# Altium footprint library hallglib.PcbLib: 89 footprints (part 5 of 6)
Each footprint in its own frame and in the unit in brackets; x right, y up, seen from the top. Pads: shape width x height; smd on the part's side, far side on the other; paste and mask are expansions set on the pad; w line width, h text height; cw(c..) or ccw(c..) is an arc to the next point about the centre after c.
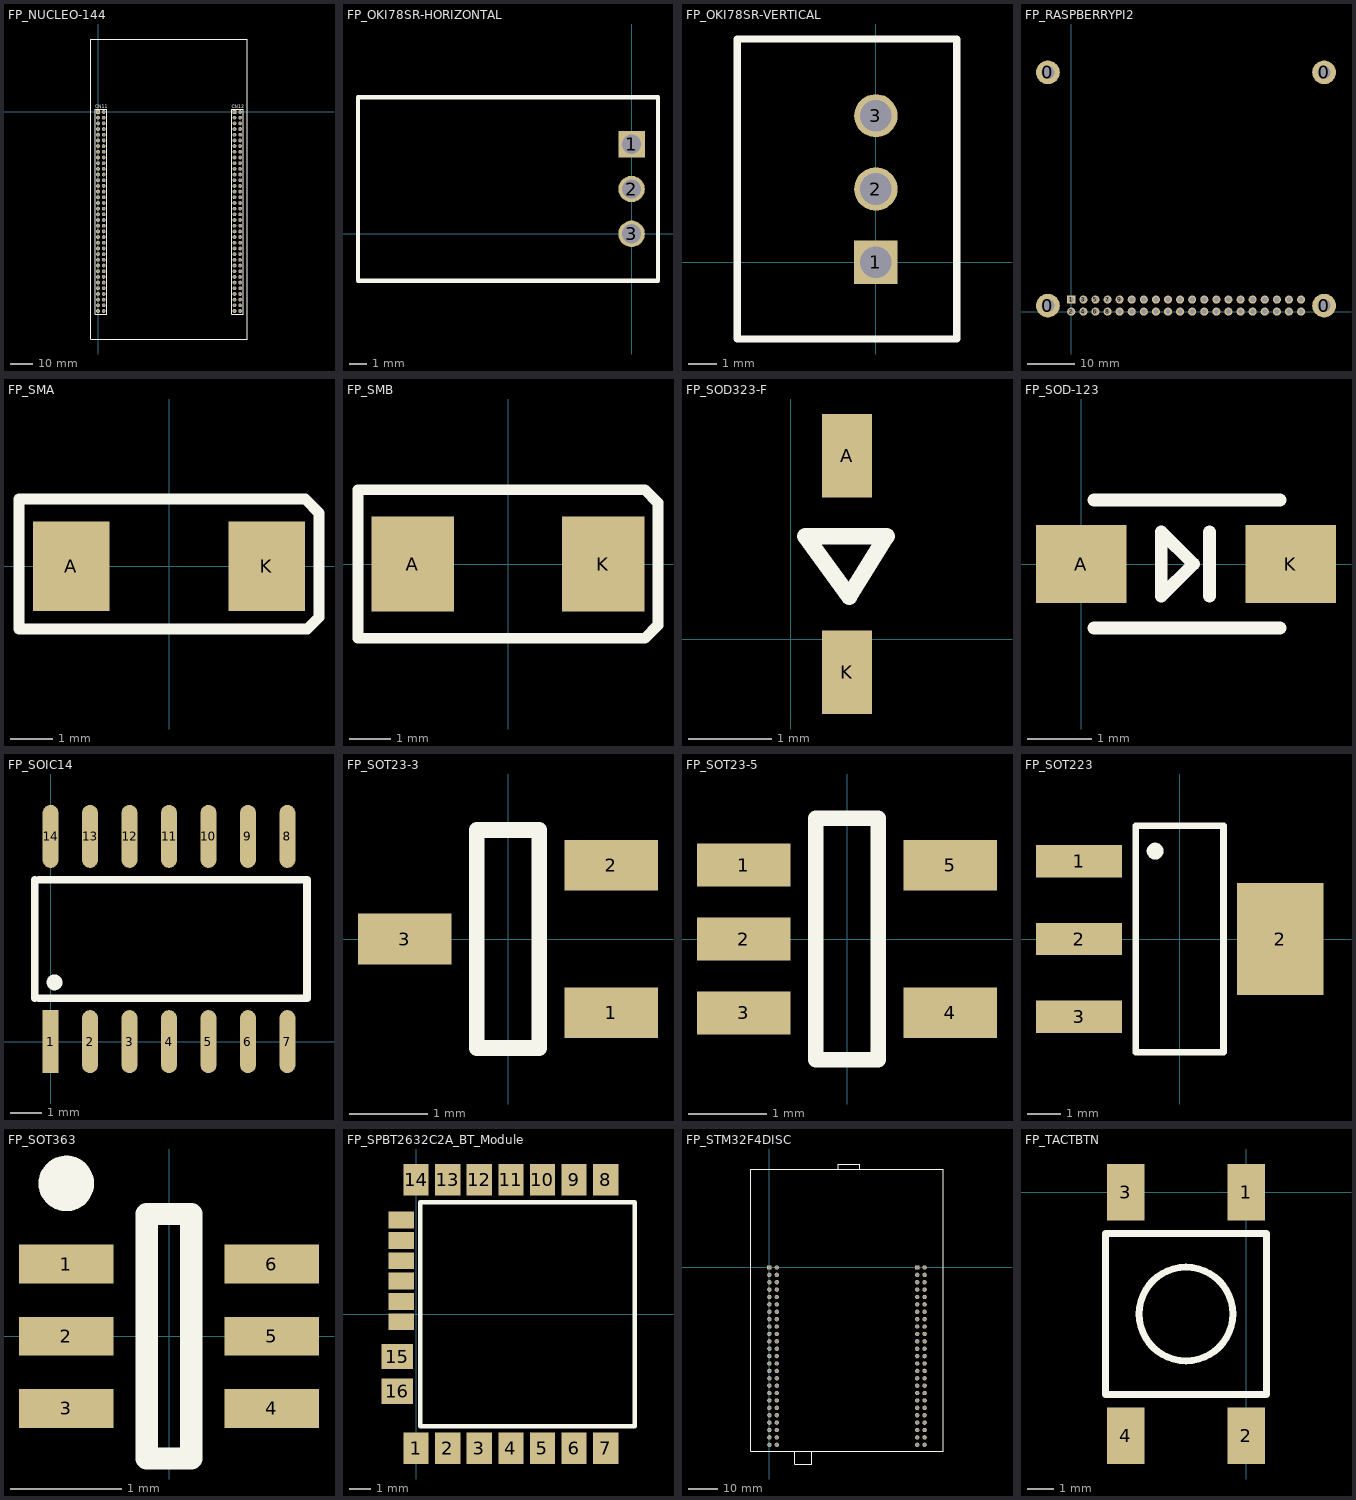
[diagram p4: the footprints below, top view; thin cyan lines are the x and y axes]

## FP_NUCLEO-144 [mm]
height 11
pads (144):
  rect 1.7x1.7 hole 1.1: 1(0,0) 73(60.96,0)
  round 1.7 hole 1.1: 2(2.54,0) 3(0,-2.54) 4(2.54,-2.54) 5(0,-5.08) 6(2.54,-5.08) 7(0,-7.62) 8(2.54,-7.62) 9(0,-10.16) 10(2.54,-10.16) 11(0,-12.7) 12(2.54,-12.7) 13(0,-15.24) 14(2.54,-15.24) 15(0,-17.78) 16(2.54,-17.78) 17(0,-20.32) 18(2.54,-20.32) 19(0,-22.86) 20(2.54,-22.86) 21(0,-25.4) 22(2.54,-25.4) 23(0,-27.94) 24(2.54,-27.94) 25(0,-30.48) 26(2.54,-30.48) 27(0,-33.02) 28(2.54,-33.02) 29(0,-35.56) 30(2.54,-35.56) 31(0,-38.1) 32(2.54,-38.1) 33(0,-40.64) 34(2.54,-40.64) 35(0,-43.18) 36(2.54,-43.18) 37(0,-45.72) 38(2.54,-45.72) 39(0,-48.26) 40(2.54,-48.26) 41(0,-50.8) 42(2.54,-50.8) 43(0,-53.34) 44(2.54,-53.34) 45(0,-55.88) 46(2.54,-55.88) 47(0,-58.42) 48(2.54,-58.42) 49(0,-60.96) 50(2.54,-60.96) 51(0,-63.5) 52(2.54,-63.5) 53(0,-66.04) 54(2.54,-66.04) 55(0,-68.58) 56(2.54,-68.58) 57(0,-71.12) 58(2.54,-71.12) 59(0,-73.66) 60(2.54,-73.66) 61(0,-76.2) 62(2.54,-76.2) 63(0,-78.74) 64(2.54,-78.74) 65(0,-81.28) 66(2.54,-81.28) 67(0,-83.82) 68(2.54,-83.82) 69(0,-86.36) 70(2.54,-86.36) 71(0,-88.9) 72(2.54,-88.9) 74(63.5,0) 75(60.96,-2.54) 76(63.5,-2.54) 77(60.96,-5.08) 78(63.5,-5.08) 79(60.96,-7.62) 80(63.5,-7.62) 81(60.96,-10.16) 82(63.5,-10.16) 83(60.96,-12.7) 84(63.5,-12.7) 85(60.96,-15.24) 86(63.5,-15.24) 87(60.96,-17.78) 88(63.5,-17.78) 89(60.96,-20.32) 90(63.5,-20.32) 91(60.96,-22.86) 92(63.5,-22.86) 93(60.96,-25.4) 94(63.5,-25.4) 95(60.96,-27.94) 96(63.5,-27.94) 97(60.96,-30.48) 98(63.5,-30.48) 99(60.96,-33.02) 100(63.5,-33.02) 101(60.96,-35.56) 102(63.5,-35.56) 103(60.96,-38.1) 104(63.5,-38.1) 105(60.96,-40.64) 106(63.5,-40.64) 107(60.96,-43.18) 108(63.5,-43.18) 109(60.96,-45.72) 110(63.5,-45.72) 111(60.96,-48.26) 112(63.5,-48.26) 113(60.96,-50.8) 114(63.5,-50.8) 115(60.96,-53.34) 116(63.5,-53.34) 117(60.96,-55.88) 118(63.5,-55.88) 119(60.96,-58.42) 120(63.5,-58.42) 121(60.96,-60.96) 122(63.5,-60.96) 123(60.96,-63.5) 124(63.5,-63.5) 125(60.96,-66.04) 126(63.5,-66.04) 127(60.96,-68.58) 128(63.5,-68.58) 129(60.96,-71.12) 130(63.5,-71.12) 131(60.96,-73.66) 132(63.5,-73.66) 133(60.96,-76.2) 134(63.5,-76.2) 135(60.96,-78.74) 136(63.5,-78.74) 137(60.96,-81.28) 138(63.5,-81.28) 139(60.96,-83.82) 140(63.5,-83.82) 141(60.96,-86.36) 142(63.5,-86.36) 143(60.96,-88.9) 144(63.5,-88.9)
Top Overlay:
  lines w0.2: -1.27,-90.3 3.81,-90.3 3.81,1.27 -1.27,1.27 -1.27,-90.3 ; 59.69,-90.3 64.77,-90.3 64.77,1.27 59.69,1.27 59.69,-90.3
  lines w0.254: -3.3,-101.4 -3.3,32.6 66.725,32.6 66.725,-101.4 -3.3,-101.4
  text "CN12" at 59.69,1.778 h1.52
  text "CN11" at -1.27,1.778 h1.52
3D body: height 11, standoff 3, extent 55.55,-1.346 56.21,-0.686
3D body: height 11, standoff 3, extent 53.01,-1.346 53.67,-0.686
3D body: height 11, standoff 3, extent 55.55,-3.886 56.21,-3.226
3D body: height 11, standoff 3, extent 53.01,-3.886 53.67,-3.226
3D body: height 11, standoff 3, extent 55.55,-6.426 56.21,-5.766
3D body: height 11, standoff 3, extent 53.01,-6.426 53.67,-5.766
3D body: height 11, standoff 3, extent 55.55,-8.966 56.21,-8.306
3D body: height 11, standoff 3, extent 53.01,-8.966 53.67,-8.306
3D body: height 11, standoff 3, extent 55.604,-11.477 56.264,-10.816
3D body: height 11, standoff 3, extent 53.064,-11.477 53.724,-10.816
3D body: height 11, standoff 3, extent 55.55,-14.046 56.21,-13.386
3D body: height 11, standoff 3, extent 53.01,-14.046 53.67,-13.386
3D body: height 11, standoff 3, extent 55.55,-16.586 56.21,-15.926
3D body: height 11, standoff 3, extent 53.01,-16.586 53.67,-15.926
3D body: height 11, standoff 3, extent 55.55,-19.126 56.21,-18.466
3D body: height 11, standoff 3, extent 53.01,-19.126 53.67,-18.466
3D body: height 11, standoff 3, extent 55.55,-21.666 56.21,-21.006
3D body: height 11, standoff 3, extent 53.01,-21.666 53.67,-21.006
3D body: height 11, standoff 3, extent 55.55,-24.206 56.21,-23.546
3D body: height 11, standoff 3, extent 53.01,-24.206 53.67,-23.546
3D body: height 11, standoff 3, extent 9.83,-10.49 10.49,-9.83
3D body: height 11, standoff 3, extent 7.29,-10.49 7.95,-9.83
3D body: height 11, standoff 3, extent 9.83,-13.03 10.49,-12.37
3D body: height 11, standoff 3, extent 7.29,-13.03 7.95,-12.37
3D body: height 11, standoff 3, extent 9.83,-15.57 10.49,-14.91
3D body: height 11, standoff 3, extent 7.29,-15.57 7.95,-14.91
3D body: height 11, standoff 3, extent 9.884,-18.081 10.544,-17.42
3D body: height 11, standoff 3, extent 7.344,-18.081 8.004,-17.42
3D body: height 11, standoff 3, extent 9.83,-20.65 10.49,-19.99
3D body: height 11, standoff 3, extent 7.29,-20.65 7.95,-19.99
3D body: height 11, standoff 3, extent 9.83,-23.19 10.49,-22.53
3D body: height 11, standoff 3, extent 7.29,-23.19 7.95,-22.53
3D body: height 11, standoff 3, extent 9.83,-25.73 10.49,-25.07
3D body: height 11, standoff 3, extent 7.29,-25.73 7.95,-25.07
3D body: height 11, standoff 3, extent 9.83,-28.27 10.49,-27.61
3D body: height 11, standoff 3, extent 7.29,-28.27 7.95,-27.61
3D body: height 11, standoff 3, extent 9.83,-33.35 10.49,-32.69
3D body: height 11, standoff 3, extent 7.29,-33.35 7.95,-32.69
3D body: height 11, standoff 3, extent 9.884,-35.861 10.544,-35.2
3D body: height 11, standoff 3, extent 7.344,-35.861 8.004,-35.2
3D body: height 11, standoff 3, extent 9.83,-38.43 10.49,-37.77
3D body: height 11, standoff 3, extent 7.29,-38.43 7.95,-37.77
3D body: height 11, standoff 3, extent 9.83,-40.97 10.49,-40.31
3D body: height 11, standoff 3, extent 7.29,-40.97 7.95,-40.31
3D body: height 11, standoff 3, extent 9.83,-43.51 10.49,-42.85
3D body: height 11, standoff 3, extent 7.29,-43.51 7.95,-42.85
3D body: height 11, standoff 3, extent 9.83,-46.05 10.49,-45.39
3D body: height 11, standoff 3, extent 7.29,-46.05 7.95,-45.39
3D body: height 11, standoff 3, extent 9.83,-48.59 10.49,-47.93
3D body: height 11, standoff 3, extent 7.29,-48.59 7.95,-47.93
3D body: height 11, standoff 3, extent 9.83,-51.13 10.49,-50.47
3D body: height 11, standoff 3, extent 7.29,-51.13 7.95,-50.47
3D body: height 11, standoff 3, extent 9.884,-53.641 10.544,-52.98
3D body: height 11, standoff 3, extent 7.344,-53.641 8.004,-52.98
3D body: height 11, standoff 3, extent 9.83,-56.21 10.49,-55.55
3D body: height 11, standoff 3, extent 7.29,-56.21 7.95,-55.55
3D body: height 11, standoff 3, extent 9.83,-58.75 10.49,-58.09
3D body: height 11, standoff 3, extent 7.29,-58.75 7.95,-58.09
3D body: height 11, standoff 3, extent 9.83,-61.29 10.49,-60.63
3D body: height 11, standoff 3, extent 7.29,-61.29 7.95,-60.63
3D body: height 11, standoff 3, extent 9.83,-63.83 10.49,-63.17
3D body: height 11, standoff 3, extent 7.29,-63.83 7.95,-63.17
3D body: height 11, standoff 3, extent 9.83,-66.37 10.49,-65.71
3D body: height 11, standoff 3, extent 7.29,-66.37 7.95,-65.71
3D body: height 11, standoff 3, extent 9.83,-68.91 10.49,-68.25
3D body: height 11, standoff 3, extent 7.29,-68.91 7.95,-68.25
3D body: height 11, standoff 8.46, extent 62.23,24.13 64.77,29.21
3D body: height 14, standoff 11, extent 63.17,27.61 63.83,28.27
3D body: height 14, standoff 11, extent 63.17,25.07 63.83,25.73
3D body: height 8.46, standoff 2.46, extent 63.17,25.07 63.83,25.73
3D body: height 8.46, standoff 2.46, extent 63.17,27.61 63.83,28.27
3D body: height 11, standoff 8.46, extent -1.27,24.13 1.27,29.21
3D body: height 14, standoff 11, extent -0.33,27.61 0.33,28.27
3D body: height 14, standoff 11, extent -0.33,25.07 0.33,25.73
3D body: height 8.46, standoff 2.46, extent -0.33,25.07 0.33,25.73
3D body: height 8.46, standoff 2.46, extent -0.33,27.61 0.33,28.27
3D body: height 12.5, standoff 11, extent -3.3,-101.4 66.7,32.6
3D body: height 11, standoff 8.46, extent -1.27,-1.27 3.81,1.27
3D body: height 11, standoff 8.46, extent -1.27,-8.89 3.81,-6.35
3D body: height 11, standoff 8.46, extent -1.27,-3.81 3.81,-1.27
3D body: height 11, standoff 8.46, extent -1.27,-6.35 3.81,-3.81
3D body: height 11, standoff 8.46, extent -1.27,-11.43 3.81,-8.89
3D body: height 11, standoff 8.46, extent -1.27,-13.97 3.81,-11.43
3D body: height 11, standoff 8.46, extent -1.27,-16.51 3.81,-13.97
3D body: height 11, standoff 8.46, extent -1.27,-19.05 3.81,-16.51
3D body: height 11, standoff 8.46, extent -1.27,-26.67 3.81,-24.13
3D body: height 11, standoff 8.46, extent -1.27,-21.59 3.81,-19.05
3D body: height 11, standoff 8.46, extent -1.27,-24.13 3.81,-21.59
3D body: height 11, standoff 8.46, extent -1.27,-29.21 3.81,-26.67
3D body: height 11, standoff 8.46, extent -1.27,-31.75 3.81,-29.21
3D body: height 11, standoff 8.46, extent -1.27,-34.29 3.81,-31.75
3D body: height 11, standoff 8.46, extent -1.27,-36.83 3.81,-34.29
3D body: height 11, standoff 8.46, extent -1.27,-44.45 3.81,-41.91
3D body: height 11, standoff 8.46, extent -1.27,-39.37 3.81,-36.83
3D body: height 11, standoff 8.46, extent -1.27,-41.91 3.81,-39.37
3D body: height 11, standoff 8.46, extent -1.27,-46.99 3.81,-44.45
3D body: height 11, standoff 8.46, extent -1.27,-49.53 3.81,-46.99
3D body: height 11, standoff 8.46, extent -1.27,-52.07 3.81,-49.53
3D body: height 11, standoff 8.46, extent -1.27,-54.61 3.81,-52.07
3D body: height 11, standoff 8.46, extent -1.27,-62.23 3.81,-59.69
3D body: height 11, standoff 8.46, extent -1.27,-57.15 3.81,-54.61
3D body: height 11, standoff 8.46, extent -1.27,-59.69 3.81,-57.15
3D body: height 11, standoff 8.46, extent -1.27,-64.77 3.81,-62.23
3D body: height 11, standoff 8.46, extent -1.27,-67.31 3.81,-64.77
3D body: height 11, standoff 8.46, extent -1.27,-69.85 3.81,-67.31
3D body: height 11, standoff 8.46, extent -1.27,-72.39 3.81,-69.85
3D body: height 11, standoff 8.46, extent -1.27,-80.01 3.81,-77.47
3D body: height 11, standoff 8.46, extent -1.27,-74.93 3.81,-72.39
3D body: height 11, standoff 8.46, extent -1.27,-77.47 3.81,-74.93
3D body: height 11, standoff 8.46, extent -1.27,-82.55 3.81,-80.01
3D body: height 11, standoff 8.46, extent -1.27,-85.09 3.81,-82.55
3D body: height 11, standoff 8.46, extent -1.27,-87.63 3.81,-85.09
3D body: height 11, standoff 8.46, extent -1.27,-90.17 3.81,-87.63
3D body: height 8.5, standoff 0, extent -1.269,-90.3 3.809,1.269
3D body: height 11, standoff 8.46, extent 59.69,-1.27 64.77,1.27
3D body: height 11, standoff 8.46, extent 59.69,-8.89 64.77,-6.35
3D body: height 11, standoff 8.46, extent 59.69,-3.81 64.77,-1.27
3D body: height 11, standoff 8.46, extent 59.69,-6.35 64.77,-3.81
3D body: height 11, standoff 8.46, extent 59.69,-11.43 64.77,-8.89
3D body: height 11, standoff 8.46, extent 59.69,-13.97 64.77,-11.43
3D body: height 11, standoff 8.46, extent 59.69,-16.51 64.77,-13.97
3D body: height 11, standoff 8.46, extent 59.69,-19.05 64.77,-16.51
3D body: height 11, standoff 8.46, extent 59.69,-26.67 64.77,-24.13
3D body: height 11, standoff 8.46, extent 59.69,-21.59 64.77,-19.05
3D body: height 11, standoff 8.46, extent 59.69,-24.13 64.77,-21.59
3D body: height 11, standoff 8.46, extent 59.69,-29.21 64.77,-26.67
3D body: height 11, standoff 8.46, extent 59.69,-31.75 64.77,-29.21
3D body: height 11, standoff 8.46, extent 59.69,-34.29 64.77,-31.75
3D body: height 11, standoff 8.46, extent 59.69,-36.83 64.77,-34.29
3D body: height 11, standoff 8.46, extent 59.69,-44.45 64.77,-41.91
3D body: height 11, standoff 8.46, extent 59.69,-39.37 64.77,-36.83
3D body: height 11, standoff 8.46, extent 59.69,-41.91 64.77,-39.37
3D body: height 11, standoff 8.46, extent 59.69,-46.99 64.77,-44.45
3D body: height 11, standoff 8.46, extent 59.69,-49.53 64.77,-46.99
3D body: height 11, standoff 8.46, extent 59.69,-52.07 64.77,-49.53
3D body: height 11, standoff 8.46, extent 59.69,-54.61 64.77,-52.07
3D body: height 11, standoff 8.46, extent 59.69,-62.23 64.77,-59.69
3D body: height 11, standoff 8.46, extent 59.69,-57.15 64.77,-54.61
3D body: height 11, standoff 8.46, extent 59.69,-59.69 64.77,-57.15
3D body: height 11, standoff 8.46, extent 59.69,-64.77 64.77,-62.23
3D body: height 11, standoff 8.46, extent 59.69,-67.31 64.77,-64.77
3D body: height 11, standoff 8.46, extent 59.69,-69.85 64.77,-67.31
3D body: height 11, standoff 8.46, extent 59.69,-72.39 64.77,-69.85
3D body: height 11, standoff 8.46, extent 59.69,-80.01 64.77,-77.47
3D body: height 11, standoff 8.46, extent 59.69,-74.93 64.77,-72.39
3D body: height 11, standoff 8.46, extent 59.69,-77.47 64.77,-74.93
3D body: height 11, standoff 8.46, extent 59.69,-82.55 64.77,-80.01
3D body: height 11, standoff 8.46, extent 59.69,-85.09 64.77,-82.55
3D body: height 11, standoff 8.46, extent 59.69,-87.63 64.77,-85.09
3D body: height 11, standoff 8.46, extent 59.69,-90.17 64.77,-87.63
3D body: height 14, standoff 11, extent 63.17,-89.23 63.83,-88.57
3D body: height 14, standoff 11, extent 60.63,-89.23 61.29,-88.57
3D body: height 8.46, standoff 2.46, extent 60.63,-89.23 61.29,-88.57
3D body: height 8.46, standoff 2.46, extent 63.17,-89.23 63.83,-88.57
3D body: height 14, standoff 11, extent 2.21,-89.23 2.87,-88.57
3D body: height 14, standoff 11, extent -0.33,-89.23 0.33,-88.57
3D body: height 8.46, standoff 2.46, extent -0.33,-89.23 0.33,-88.57
3D body: height 8.46, standoff 2.46, extent 2.21,-89.23 2.87,-88.57
3D body: height 8.5, standoff 0, extent 59.691,-90.3 64.769,1.269
3D body: height 11, standoff 3, extent 55.55,-28.27 56.21,-27.61
3D body: height 11, standoff 3, extent 53.01,-28.27 53.67,-27.61
3D body: height 11, standoff 3, extent 55.55,-30.81 56.21,-30.15
3D body: height 11, standoff 3, extent 53.01,-30.81 53.67,-30.15
3D body: height 11, standoff 3, extent 55.55,-33.35 56.21,-32.69
3D body: height 11, standoff 3, extent 53.01,-33.35 53.67,-32.69
3D body: height 11, standoff 3, extent 55.604,-35.861 56.264,-35.2
3D body: height 11, standoff 3, extent 53.064,-35.861 53.724,-35.2
3D body: height 11, standoff 3, extent 55.55,-38.43 56.21,-37.77
3D body: height 11, standoff 3, extent 53.01,-38.43 53.67,-37.77
3D body: height 11, standoff 3, extent 55.55,-40.97 56.21,-40.31
3D body: height 11, standoff 3, extent 53.01,-40.97 53.67,-40.31
3D body: height 11, standoff 3, extent 55.55,-43.51 56.21,-42.85
3D body: height 11, standoff 3, extent 53.01,-43.51 53.67,-42.85
3D body: height 11, standoff 3, extent 55.55,-46.05 56.21,-45.39
3D body: height 11, standoff 3, extent 53.01,-46.05 53.67,-45.39
3D body: height 11, standoff 3, extent 55.55,-48.59 56.21,-47.93
3D body: height 11, standoff 3, extent 53.01,-48.59 53.67,-47.93
3D body: height 11, standoff 3, extent 55.55,-51.13 56.21,-50.47
3D body: height 11, standoff 3, extent 53.01,-51.13 53.67,-50.47
3D body: height 11, standoff 3, extent 55.604,-53.641 56.264,-52.98
3D body: height 11, standoff 3, extent 53.064,-53.641 53.724,-52.98
3D body: height 11, standoff 3, extent 55.55,-56.21 56.21,-55.55
3D body: height 11, standoff 3, extent 53.01,-56.21 53.67,-55.55
3D body: height 11, standoff 3, extent 55.55,-58.75 56.21,-58.09
3D body: height 11, standoff 3, extent 53.01,-58.75 53.67,-58.09
3D body: height 11, standoff 3, extent 55.55,-61.29 56.21,-60.63
3D body: height 11, standoff 3, extent 53.01,-61.29 53.67,-60.63
3D body: height 11, standoff 3, extent 55.55,-63.83 56.21,-63.17
3D body: height 11, standoff 3, extent 53.01,-63.83 53.67,-63.17
3D body: height 11, standoff 3, extent 55.55,-66.37 56.21,-65.71
3D body: height 11, standoff 3, extent 53.01,-66.37 53.67,-65.71
3D body: height 11, standoff 3, extent 55.55,-68.91 56.21,-68.25
3D body: height 11, standoff 3, extent 53.01,-68.91 53.67,-68.25

## FP_OKI78SR-HORIZONTAL [mm] "OKI regulator"
height 8.6
pads (3):
  rect 1.5x1.5 hole 1.1: 1(0,5.08)
  round 1.5 hole 1.1: 2(0,2.54) 3(0,0)
Top Overlay:
  lines w0.254: -15.5,-2.66 1.5,-2.66 1.5,7.74 -15.5,7.74 -15.5,-2.66
3D body "mps_dcdc_oki_78sr_horiz_a.step": height 7.67, standoff -5.26, extent -15.235,-2.621 1.275,7.793

## FP_OKI78SR-VERTICAL [mm] "OKI regulator"
height 16.5
pads (3):
  rect 1.5x1.5 hole 1.1: 1(0,0)
  round 1.5 hole 1.1: 2(0,2.54) 3(0,5.08)
Top Overlay:
  lines w0.254: -4.8,-2.66 -4.8,7.74 2.8,7.74 2.8,-2.66 -4.8,-2.66
3D body "mps_dcdc_oki_78sr_a.step": height 16.52, standoff -3.29, extent -4.875,-2.667 2.859,7.747

## FP_RASPBERRYPI2 [mm] "Raspberry Pi 2"
pads (44):
  round 5 hole 2.7: 0(-4.9,1.25) 0(-4.9,50.25) 0(53.1,1.25) 0(53.1,50.25)
  rect 1.7x1.7 hole 1.1: 1(0,2.54)
  round 1.7 hole 1.1: 2(0,0) 3(2.54,2.54) 4(2.54,0) 5(5.08,2.54) 6(5.08,0) 7(7.62,2.54) 8(7.62,0) 9(10.16,2.54) 10(10.16,0) 11(12.7,2.54) 12(12.7,0) 13(15.24,2.54) 14(15.24,0) 15(17.78,2.54) 16(17.78,0) 17(20.32,2.54) 18(20.32,0) 19(22.86,2.54) 20(22.86,0) 21(25.4,2.54) 22(25.4,0) 23(27.94,2.54) 24(27.94,0) 25(30.48,2.54) 26(30.48,0) 27(33.02,2.54) 28(33.02,0) 29(35.56,2.54) 30(35.56,0) 31(38.1,2.54) 32(38.1,0) 33(40.64,2.54) 34(40.64,0) 35(43.18,2.54) 36(43.18,0) 37(45.72,2.54) 38(45.72,0) 39(48.26,2.54) 40(48.26,0)
3D body "Raspberry_Pi_Model_B+_3D_Assy.STEP": height 13.87, standoff -5.53, extent -8.001,-2.413 79.149,56.087
3D body: height 9, standoff 0, extent -1.27,-1.27 50.165,3.81
3D body: height 0, standoff -3.2, extent -0.325,2.34 0.325,2.74
3D body: height 0, standoff -3.2, extent 2.215,2.34 2.865,2.74
3D body: height 0, standoff -3.2, extent 4.755,2.34 5.405,2.74
3D body: height 0, standoff -3.2, extent 7.295,2.34 7.945,2.74
3D body: height 0, standoff -3.2, extent 9.835,2.34 10.485,2.74
3D body: height 0, standoff -3.2, extent 12.375,2.34 13.025,2.74
3D body: height 0, standoff -3.2, extent 14.915,2.34 15.565,2.74
3D body: height 0, standoff -3.2, extent 17.455,2.34 18.105,2.74
3D body: height 0, standoff -3.2, extent 19.995,2.34 20.645,2.74
3D body: height 0, standoff -3.2, extent 22.535,2.34 23.185,2.74
3D body: height 0, standoff -3.2, extent 25.075,2.34 25.725,2.74
3D body: height 0, standoff -3.2, extent 27.615,2.34 28.265,2.74
3D body: height 0, standoff -3.2, extent 30.155,2.34 30.805,2.74
3D body: height 0, standoff -3.2, extent 32.695,2.34 33.345,2.74
3D body: height 0, standoff -3.2, extent 35.235,2.34 35.885,2.74
3D body: height 0, standoff -3.2, extent 37.775,2.34 38.425,2.74
3D body: height 0, standoff -3.2, extent 40.315,2.34 40.965,2.74
3D body: height 0, standoff -3.2, extent 42.855,2.34 43.505,2.74
3D body: height 0, standoff -3.2, extent 45.395,2.34 46.045,2.74
3D body: height 0, standoff -3.2, extent 47.935,2.34 48.585,2.74
3D body: height 0, standoff -3.2, extent -0.325,-0.2 0.325,0.2
3D body: height 0, standoff -3.2, extent 2.215,-0.2 2.865,0.2
3D body: height 0, standoff -3.2, extent 4.755,-0.2 5.405,0.2
3D body: height 0, standoff -3.2, extent 7.295,-0.2 7.945,0.2
3D body: height 0, standoff -3.2, extent 9.835,-0.2 10.485,0.2
3D body: height 0, standoff -3.2, extent 12.375,-0.2 13.025,0.2
3D body: height 0, standoff -3.2, extent 14.915,-0.2 15.565,0.2
3D body: height 0, standoff -3.2, extent 17.455,-0.2 18.105,0.2
3D body: height 0, standoff -3.2, extent 19.995,-0.2 20.645,0.2
3D body: height 0, standoff -3.2, extent 22.535,-0.2 23.185,0.2
3D body: height 0, standoff -3.2, extent 25.075,-0.2 25.725,0.2
3D body: height 0, standoff -3.2, extent 27.615,-0.2 28.265,0.2
3D body: height 0, standoff -3.2, extent 30.155,-0.2 30.805,0.2
3D body: height 0, standoff -3.2, extent 32.695,-0.2 33.345,0.2
3D body: height 0, standoff -3.2, extent 35.235,-0.2 35.885,0.2
3D body: height 0, standoff -3.2, extent 37.775,-0.2 38.425,0.2
3D body: height 0, standoff -3.2, extent 40.315,-0.2 40.965,0.2
3D body: height 0, standoff -3.2, extent 42.855,-0.2 43.505,0.2
3D body: height 0, standoff -3.2, extent 45.395,-0.2 46.045,0.2
3D body: height 0, standoff -3.2, extent 47.935,-0.2 48.585,0.2

## FP_SMA [mm] "SMA footprint"
height 2
pads (2):
  rect 1.8x2.1 smd: A(-2.3,0) K(2.3,0)
Top Overlay:
  lines w0.254: -3.525,-1.475 -3.525,1.575 3.2,1.575 3.525,1.25 3.525,-1.2 3.25,-1.475 -3.525,-1.475
3D body "User Library-S1G-1.STEP": height 2.7, standoff 0, extent -2.8,-1.475 2.8,1.475

## FP_SMB [mm] "DO214-AA tok (SMB)"
height 2.5
pads (2):
  rect 2x2.3 smd: A(-2.3,0) K(2.3,0)
Top Overlay:
  lines w0.254: -3.625,-1.8 3.3,-1.8 3.625,-1.475 3.625,1.475 3.3,1.8 -3.625,1.8 -3.625,-1.8
3D body "DO-214AA SMB.STEP": height 2.32, standoff 0.02, extent -2.7,-1.8 2.7,1.8

## FP_SOD323-F [mm] "SOD323-F (SC-90)"
height 0.8
pads (2):
  rect 0.6x1 smd: A(0.675,2.2) K(0.675,-0.4)
Top Overlay:
  lines w0.2: 0.175,1.233 0.7,0.508 1.15,1.233 0.175,1.233
3D body "SOD-323F.STEP": height 0.79, standoff -0.08, extent 0.022,-0.461 1.372,2.239

## FP_SOD-123 [mm]
height 1.168
pads (2):
  rect 1.41x1.22 smd: A(0,0) K(3.27,0)
Top Overlay:
  lines w0.2: 0.2,-1 3.1,-1 ; 0.2,1 3.1,1 ; 2,-0.5 2,0.5 ; 1.25,-0.5 1.25,0.5 1.75,0 1.25,-0.5
3D body "SOD-123_DiodesInc.STEP": height 1.47, standoff 0.02, extent -0.3,-0.85 3.55,0.85

## FP_SOIC14 [mil] "SOIC-14 egyesek szerint narrow, RET szerint normál"
height 69
pads (14):
  rect 20x80 smd: 1(0,0)
  oval 20x80 smd: 2(50,0) 3(100,0) 4(150,0) 5(200,0) 6(250,0) 7(300,0) 8(300,260) 9(250,260) 10(200,260) 11(150,260) 12(100,260) 13(50,260) 14(0,260)
Top Overlay:
  circle w10: c5,75 r5
  lines w10: -20,55 -20,205 ; -15,55 325,55 325,205 -15,205
3D body "SOIC14N.STEP": height 62.99, standoff 0, extent -22.25,9.8 322.24,248.21

## FP_SOT23-3 [mm] "SOT23-3 tok"
height 1.1
pads (3):
  rect 1.2x0.65 smd: 1(1.327,-0.95) 2(1.327,0.95) 3(-1.327,0)
Top Overlay:
  lines w0.2: -0.4,-1.4 -0.4,1.4 0.4,1.4 0.4,-1.4 -0.4,-1.4
3D body "SOT-23.STEP": height 0.97, standoff -0.01, extent -1.274,-1.46 1.274,1.46

## FP_SOT23-5 [mm] "SOT23, 5-Leads, Body 2.9x1.6mm, Pitch 0.95mm, Lead Span 2.8mm, IPC Medium Density"
height 1.19
pads (5):
  rect 1.2x0.55 smd: 1(-1.327,0.95) 2(-1.327,0) 3(-1.327,-0.95)
  rect 1.2x0.65 smd: 4(1.327,-0.95) 5(1.327,0.95)
Top Overlay:
  lines w0.2: -0.4,-1.55 -0.4,1.55 0.4,1.55 0.4,-1.55 -0.4,-1.55
3D body "SOT-23-5.STEP": height 1, standoff 0, extent -1.17,-1.46 1.17,1.46

## FP_SOT223 [mm] "SOT223 package, 3 leads"
height 1.8
pads (4):
  rect 2.55x0.95 smd: 1(-2.975,2.3) 2(-2.975,0) 3(-2.975,-2.3)
  rect 2.55x3.3 smd: 2(2.975,0)
Top Overlay:
  circle w0.25: c-0.725,2.6 r0.125
  lines w0.2: -1.3,-3.35 1.3,-3.35 1.3,3.35 -1.3,3.35 -1.3,-3.35
3D body "SOT-223-1.STEP": height 1.65, standoff 0, extent -3.5,-3.25 3.5,3.25

## FP_SOT363 [mm] "SOT363 (SC-88) package 6 leads"
height 1.1
pads (6):
  rect 0.85x0.35 smd: 1(-0.925,0.65) 2(-0.925,0) 3(-0.925,-0.65) 4(0.925,-0.65) 5(0.925,0) 6(0.925,0.65)
Top Overlay:
  circle w0.25: c-0.925,1.375 r0.125
  lines w0.2: -0.2,-1.1 -0.2,1.1 0.2,1.1 0.2,-1.1 -0.2,-1.1
3D body "SOT363.STEP": height 0.98, standoff -0.01, extent -1.05,-1 1.05,1

## FP_SPBT2632C2A_BT_Module [mm] "Bluetooth technology class-2 module"
height 2.9
pads (22):
  rect 1.2x1.5 smd: 1(0,-6.37) 2(1.5,-6.37) 3(3,-6.37) 4(4.5,-6.37) 5(6,-6.37) 6(7.5,-6.37) 7(9,-6.37) 8(9,6.37) 9(7.5,6.37) 10(6,6.37) 11(4.5,6.37) 12(3,6.37) 13(1.5,6.37) 14(0,6.37)
  rect 1.5x1.2 smd: 15(-0.9,-2.02) 16(-0.9,-3.67)
  rect 1.2x0.8 smd: ""(-0.7,-0.37) ""(-0.7,0.595) ""(-0.7,1.56) ""(-0.7,2.525) ""(-0.7,3.49) ""(-0.7,4.455)
Top Overlay:
  lines w0.2: 0.2,-5.325 10.375,-5.325 10.375,5.3 0.2,5.3 0.2,-5.325
3D body: height 1.5, standoff 0, extent -1.228,-6.75 10.372,6.75

## FP_STM32F4DISC [mm] "STM32 F4 Discovery evaluation board"
pads (100):
  rect 1.5x1.5 hole 1.1: 1(0,0) 51(50.8,0)
  round 1.5 hole 1.1: 2(2.54,0) 3(0,-2.54) 4(2.54,-2.54) 5(0,-5.08) 6(2.54,-5.08) 7(0,-7.62) 8(2.54,-7.62) 9(0,-10.16) 10(2.54,-10.16) 11(0,-12.7) 12(2.54,-12.7) 13(0,-15.24) 14(2.54,-15.24) 15(0,-17.78) 16(2.54,-17.78) 17(0,-20.32) 18(2.54,-20.32) 19(0,-22.86) 20(2.54,-22.86) 21(0,-25.4) 22(2.54,-25.4) 23(0,-27.94) 24(2.54,-27.94) 25(0,-30.48) 26(2.54,-30.48) 27(0,-33.02) 28(2.54,-33.02) 29(0,-35.56) 30(2.54,-35.56) 31(0,-38.1) 32(2.54,-38.1) 33(0,-40.64) 34(2.54,-40.64) 35(0,-43.18) 36(2.54,-43.18) 37(0,-45.72) 38(2.54,-45.72) 39(0,-48.26) 40(2.54,-48.26) 41(0,-50.8) 42(2.54,-50.8) 43(0,-53.34) 44(2.54,-53.34) 45(0,-55.88) 46(2.54,-55.88) 47(0,-58.42) 48(2.54,-58.42) 49(0,-60.96) 50(2.54,-60.96) 52(53.34,0) 53(50.8,-2.54) 54(53.34,-2.54) 55(50.8,-5.08) 56(53.34,-5.08) 57(50.8,-7.62) 58(53.34,-7.62) 59(50.8,-10.16) 60(53.34,-10.16) 61(50.8,-12.7) 62(53.34,-12.7) 63(50.8,-15.24) 64(53.34,-15.24) 65(50.8,-17.78) 66(53.34,-17.78) 67(50.8,-20.32) 68(53.34,-20.32) 69(50.8,-22.86) 70(53.34,-22.86) 71(50.8,-25.4) 72(53.34,-25.4) 73(50.8,-27.94) 74(53.34,-27.94) 75(50.8,-30.48) 76(53.34,-30.48) 77(50.8,-33.02) 78(53.34,-33.02) 79(50.8,-35.56) 80(53.34,-35.56) 81(50.8,-38.1) 82(53.34,-38.1) 83(50.8,-40.64) 84(53.34,-40.64) 85(50.8,-43.18) 86(53.34,-43.18) 87(50.8,-45.72) 88(53.34,-45.72) 89(50.8,-48.26) 90(53.34,-48.26) 91(50.8,-50.8) 92(53.34,-50.8) 93(50.8,-53.34) 94(53.34,-53.34) 95(50.8,-55.88) 96(53.34,-55.88) 97(50.8,-58.42) 98(53.34,-58.42) 99(50.8,-60.96) 100(53.34,-60.96)
Top Overlay:
  lines w0.254: 8.636,-63.18 8.636,-67.564 14.605,-67.564 14.605,-63.18 ; 20.574,33.82 23.622,33.82 23.622,35.56 30.988,35.56 30.988,33.82 ; -6.33,-63.18 59.67,-63.18 59.67,33.82 -6.33,33.82 -6.33,-63.18
3D body: height 0, standoff -3.2, extent 53.14,-61.285 53.54,-60.635
3D body: height 0, standoff -3.2, extent 53.14,-58.745 53.54,-58.095
3D body: height 0, standoff -3.2, extent 53.14,-56.205 53.54,-55.555
3D body: height 0, standoff -3.2, extent 53.14,-53.665 53.54,-53.015
3D body: height 0, standoff -3.2, extent 53.14,-51.125 53.54,-50.475
3D body: height 0, standoff -3.2, extent 53.14,-48.585 53.54,-47.935
3D body: height 0, standoff -3.2, extent 53.14,-46.045 53.54,-45.395
3D body: height 0, standoff -3.2, extent 53.14,-43.505 53.54,-42.855
3D body: height 0, standoff -3.2, extent 53.14,-40.965 53.54,-40.315
3D body: height 0, standoff -3.2, extent 53.14,-38.425 53.54,-37.775
3D body: height 0, standoff -3.2, extent 53.14,-35.885 53.54,-35.235
3D body: height 0, standoff -3.2, extent 53.14,-33.345 53.54,-32.695
3D body: height 0, standoff -3.2, extent 53.14,-30.805 53.54,-30.155
3D body: height 0, standoff -3.2, extent 53.14,-28.265 53.54,-27.615
3D body: height 0, standoff -3.2, extent 53.14,-25.725 53.54,-25.075
3D body: height 0, standoff -3.2, extent 53.14,-23.185 53.54,-22.535
3D body: height 0, standoff -3.2, extent 53.14,-20.645 53.54,-19.995
3D body: height 0, standoff -3.2, extent 53.14,-18.105 53.54,-17.455
3D body: height 0, standoff -3.2, extent 53.14,-15.565 53.54,-14.915
3D body: height 0, standoff -3.2, extent 53.14,-13.025 53.54,-12.375
3D body: height 0, standoff -3.2, extent 53.14,-10.485 53.54,-9.835
3D body: height 0, standoff -3.2, extent 53.14,-7.945 53.54,-7.295
3D body: height 0, standoff -3.2, extent 53.14,-5.405 53.54,-4.755
3D body: height 0, standoff -3.2, extent 53.14,-2.865 53.54,-2.215
3D body: height 0, standoff -3.2, extent 53.14,-0.325 53.54,0.325
3D body: height 0, standoff -3.2, extent 50.6,-61.285 51,-60.635
3D body: height 0, standoff -3.2, extent 50.6,-58.745 51,-58.095
3D body: height 0, standoff -3.2, extent 50.6,-56.205 51,-55.555
3D body: height 0, standoff -3.2, extent 50.6,-53.665 51,-53.015
3D body: height 0, standoff -3.2, extent 50.6,-51.125 51,-50.475
3D body: height 0, standoff -3.2, extent 50.6,-48.585 51,-47.935
3D body: height 0, standoff -3.2, extent 50.6,-46.045 51,-45.395
3D body: height 0, standoff -3.2, extent 50.6,-43.505 51,-42.855
3D body: height 0, standoff -3.2, extent 50.6,-40.965 51,-40.315
3D body: height 0, standoff -3.2, extent 50.6,-38.425 51,-37.775
3D body: height 0, standoff -3.2, extent 50.6,-35.885 51,-35.235
3D body: height 0, standoff -3.2, extent 50.6,-33.345 51,-32.695
3D body: height 0, standoff -3.2, extent 50.6,-30.805 51,-30.155
3D body: height 0, standoff -3.2, extent 50.6,-28.265 51,-27.615
3D body: height 0, standoff -3.2, extent 50.6,-25.725 51,-25.075
3D body: height 0, standoff -3.2, extent 50.6,-23.185 51,-22.535
3D body: height 0, standoff -3.2, extent 50.6,-20.645 51,-19.995
3D body: height 0, standoff -3.2, extent 50.6,-18.105 51,-17.455
3D body: height 0, standoff -3.2, extent 50.6,-15.565 51,-14.915
3D body: height 0, standoff -3.2, extent 50.6,-13.025 51,-12.375
3D body: height 0, standoff -3.2, extent 50.6,-10.485 51,-9.835
3D body: height 0, standoff -3.2, extent 50.6,-7.945 51,-7.295
3D body: height 0, standoff -3.2, extent 50.6,-5.405 51,-4.755
3D body: height 0, standoff -3.2, extent 50.6,-2.865 51,-2.215
3D body: height 0, standoff -3.2, extent 50.6,-0.325 51,0.325
3D body: height 0, standoff -3.2, extent 2.34,-61.285 2.74,-60.635
3D body: height 0, standoff -3.2, extent 2.34,-58.745 2.74,-58.095
3D body: height 0, standoff -3.2, extent 2.34,-56.205 2.74,-55.555
3D body: height 0, standoff -3.2, extent 2.34,-53.665 2.74,-53.015
3D body: height 0, standoff -3.2, extent 2.34,-51.125 2.74,-50.475
3D body: height 0, standoff -3.2, extent 2.34,-48.585 2.74,-47.935
3D body: height 0, standoff -3.2, extent 2.34,-46.045 2.74,-45.395
3D body: height 0, standoff -3.2, extent 2.34,-43.505 2.74,-42.855
3D body: height 0, standoff -3.2, extent 2.34,-40.965 2.74,-40.315
3D body: height 0, standoff -3.2, extent 2.34,-38.425 2.74,-37.775
3D body: height 0, standoff -3.2, extent 2.34,-35.885 2.74,-35.235
3D body: height 0, standoff -3.2, extent 2.34,-33.345 2.74,-32.695
3D body: height 0, standoff -3.2, extent 2.34,-30.805 2.74,-30.155
3D body: height 0, standoff -3.2, extent 2.34,-28.265 2.74,-27.615
3D body: height 0, standoff -3.2, extent 2.34,-25.725 2.74,-25.075
3D body: height 0, standoff -3.2, extent 2.34,-23.185 2.74,-22.535
3D body: height 0, standoff -3.2, extent 2.34,-20.645 2.74,-19.995
3D body: height 0, standoff -3.2, extent 2.34,-18.105 2.74,-17.455
3D body: height 0, standoff -3.2, extent 2.34,-15.565 2.74,-14.915
3D body: height 0, standoff -3.2, extent 2.34,-13.025 2.74,-12.375
3D body: height 0, standoff -3.2, extent 2.34,-10.485 2.74,-9.835
3D body: height 0, standoff -3.2, extent 2.34,-7.945 2.74,-7.295
3D body: height 0, standoff -3.2, extent 2.34,-5.405 2.74,-4.755
3D body: height 0, standoff -3.2, extent 2.34,-2.865 2.74,-2.215
3D body: height 0, standoff -3.2, extent 2.34,-0.325 2.74,0.325
3D body: height 0, standoff -3.2, extent -0.2,-61.285 0.2,-60.635
3D body: height 0, standoff -3.2, extent -0.2,-58.745 0.2,-58.095
3D body: height 0, standoff -3.2, extent -0.2,-56.205 0.2,-55.555
3D body: height 0, standoff -3.2, extent -0.2,-53.665 0.2,-53.015
3D body: height 0, standoff -3.2, extent -0.2,-51.125 0.2,-50.475
3D body: height 0, standoff -3.2, extent -0.2,-48.585 0.2,-47.935
3D body: height 0, standoff -3.2, extent -0.2,-46.045 0.2,-45.395
3D body: height 0, standoff -3.2, extent -0.2,-43.505 0.2,-42.855
3D body: height 0, standoff -3.2, extent -0.2,-40.965 0.2,-40.315
3D body: height 0, standoff -3.2, extent -0.2,-38.425 0.2,-37.775
3D body: height 0, standoff -3.2, extent -0.2,-35.885 0.2,-35.235
3D body: height 0, standoff -3.2, extent -0.2,-33.345 0.2,-32.695
3D body: height 0, standoff -3.2, extent -0.2,-30.805 0.2,-30.155
3D body: height 0, standoff -3.2, extent -0.2,-28.265 0.2,-27.615
3D body: height 0, standoff -3.2, extent -0.2,-25.725 0.2,-25.075
3D body: height 0, standoff -3.2, extent -0.2,-23.185 0.2,-22.535
3D body: height 0, standoff -3.2, extent -0.2,-20.645 0.2,-19.995
3D body: height 0, standoff -3.2, extent -0.2,-18.105 0.2,-17.455
3D body: height 0, standoff -3.2, extent -0.2,-15.565 0.2,-14.915
3D body: height 0, standoff -3.2, extent -0.2,-13.025 0.2,-12.375
3D body: height 0, standoff -3.2, extent -0.2,-10.485 0.2,-9.835
3D body: height 0, standoff -3.2, extent -0.2,-7.945 0.2,-7.295
3D body: height 0, standoff -3.2, extent -0.2,-5.405 0.2,-4.755
3D body: height 0, standoff -3.2, extent -0.2,-2.865 0.2,-2.215
3D body: height 0, standoff -3.2, extent -0.2,-0.325 0.2,0.325
3D body: height 9, standoff 2, extent 52.07,26.67 54.61,31.75
3D body: height 9, standoff 2, extent -1.27,26.67 1.27,31.75
3D body: height 9, standoff 0, extent 49.53,-62.23 54.61,1.27
3D body: height 9, standoff 0, extent -1.27,-62.23 3.81,1.27
3D body: height 20.6, standoff 16.6, extent 39.688,8.065 42.355,18.098
3D body: height 20.6, standoff 16.6, extent 10.414,-11.049 12.446,-6.35
3D body: height 20.6, standoff 16.6, extent -1.27,8.636 1.143,23.622
3D body: height 22.6, standoff 16.6, extent 12.618,-34.036 17.1,-29.545
3D body: height 22.6, standoff 16.6, extent 36.376,-33.995 40.858,-29.504
3D body: height 16.6, standoff 9, extent -6.33,-63.18 59.67,35.56
3D body: height 24.6, standoff 16.6, extent 8.382,-63.119 16.51,-49.403
3D body: height 22.59, standoff 16.61, extent 8.569,-67.691 14.545,-63.261

## FP_TACTBTN [mm] "TE CONNECTIVITY / ALCOSWITCH - FSM2JSMA"
height 4.44
pads (4):
  rect 1.4x2.1 smd: 1(0,0) 2(0,-9.1) 3(-4.5,0) 4(-4.5,-9.1)
Top Overlay:
  circle w0.254: c-2.25,-4.55 r1.75
  lines w0.254: -5.25,-7.55 0.75,-7.55 0.75,-1.55 -5.25,-1.55 -5.25,-7.55
3D body "TACT_SMD_6X6.STEP": height 5, standoff -0.05, extent -5.225,-8.575 0.775,-0.425